# Altium footprint library PCBKU.PcbLib: 197 footprints (part 10 of 13)
Each footprint in its own frame and in the unit in brackets; x right, y up, seen from the top. Pads: shape width x height; smd on the part's side, far side on the other; paste and mask are expansions set on the pad; w line width, h text height; cw(c..) or ccw(c..) is an arc to the next point about the centre after c.
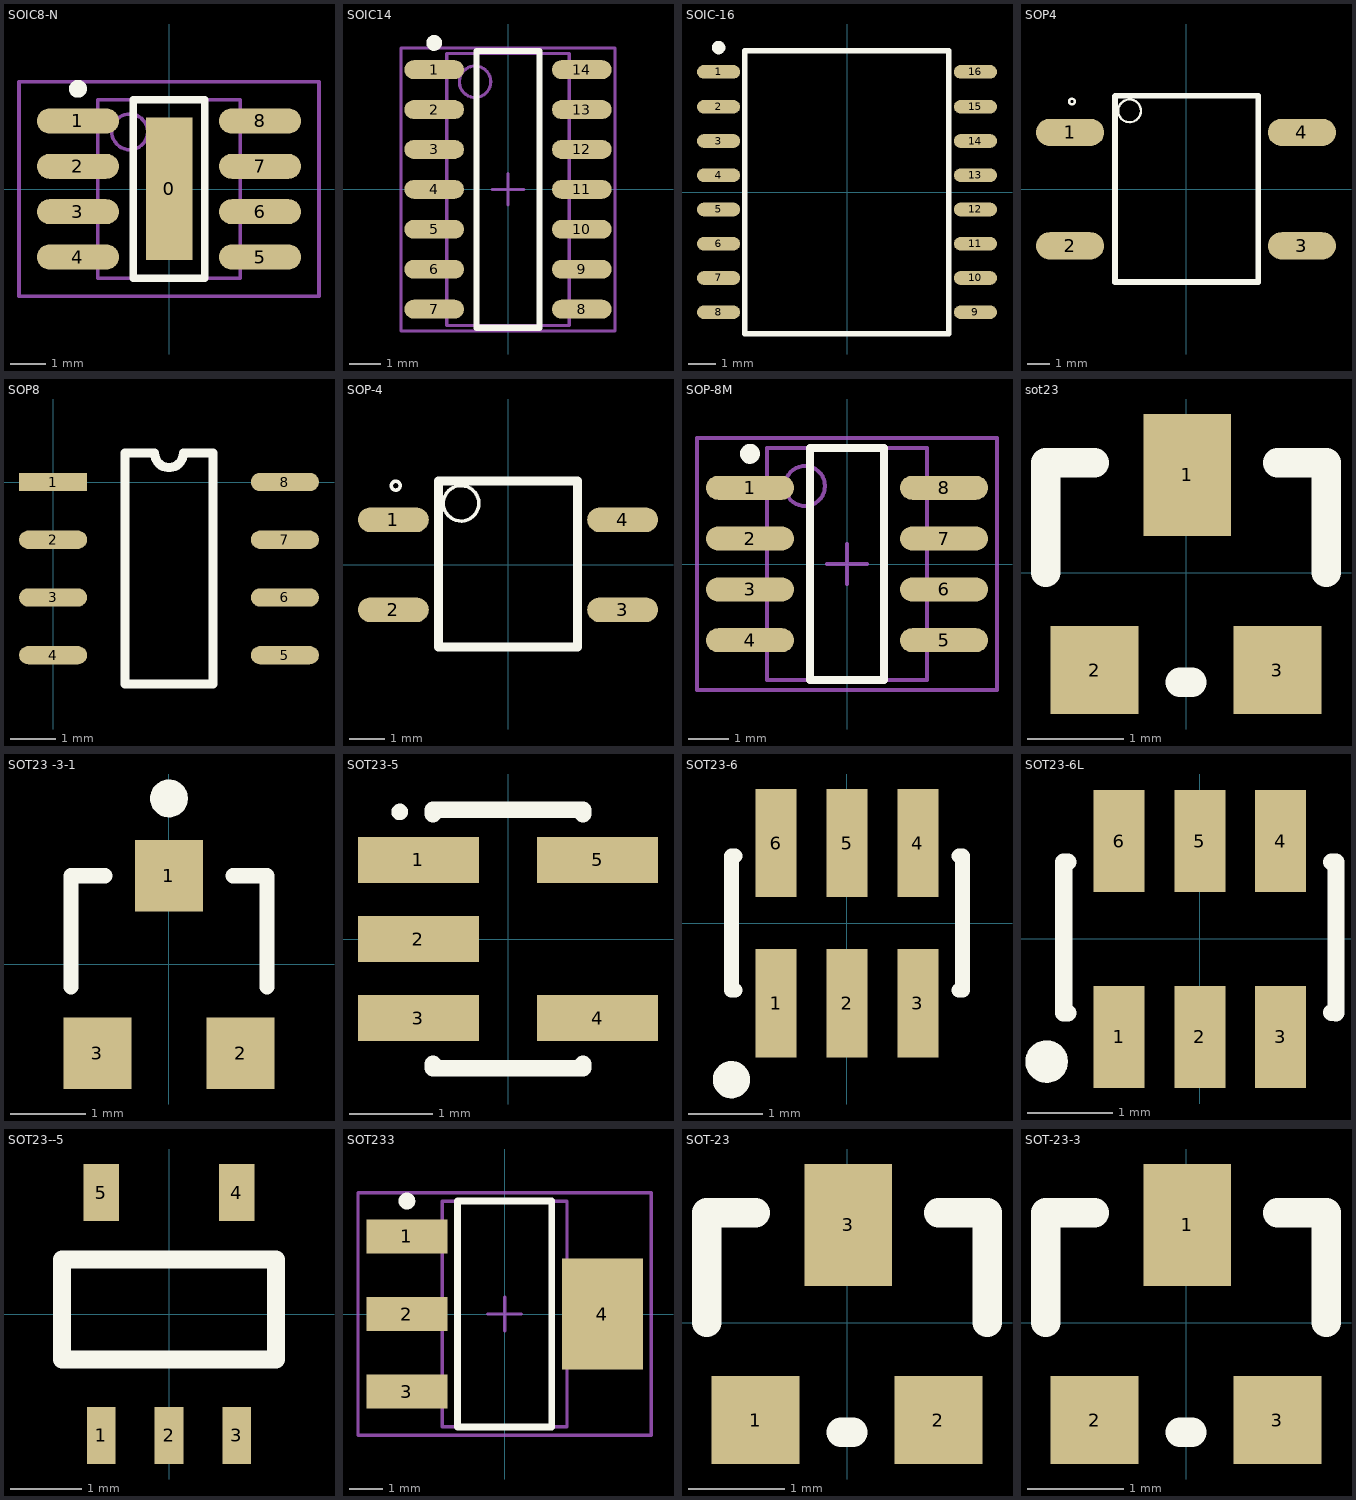
[diagram p9: the footprints below, top view; thin cyan lines are the x and y axes]

## SOIC8-N [mm]
pads (9):
  rect 1.3x4 smd: 0(0.011,0.007)
  oval 2.3x0.7 smd: 1(-2.55,1.905) 2(-2.55,0.635) 3(-2.55,-0.635) 4(-2.55,-1.905) 5(2.55,-1.905) 6(2.55,-0.635) 7(2.55,0.635) 8(2.55,1.905)
Top Overlay:
  circle w0.25: c-2.55,2.805 r0.125
  lines w0.2: -1,-2.5 -1,2.5 1,2.5 1,-2.5 -1,-2.5
Mechanical 13:
  circle w0.1: c-1.1,1.6 r0.5
  lines w0.1: -2,-2.5 -2,2.5 2,2.5 2,-2.5 -2,-2.5
Mechanical 15:
  lines w0.1: -0.5,0 0.5,0 ; 0,-0.5 0,0.5 ; -4.2,-3 -4.2,3 4.2,3 4.2,-3 -4.2,-3
3D body: height 1.55, standoff 0, extent -2,-2.5 2,2.5

## SOIC14 [mm] "14-Pin Small Outline Integrated Circuit 1.27 mm Pitch, IPC High Density"
height 1.91
pads (14):
  oval 1.9x0.6 smd: 1(-2.35,3.81) 2(-2.35,2.54) 3(-2.35,1.27) 4(-2.35,0) 5(-2.35,-1.27) 6(-2.35,-2.54) 7(-2.35,-3.81) 8(2.35,-3.81) 9(2.35,-2.54) 10(2.35,-1.27) 11(2.35,0) 12(2.35,1.27) 13(2.35,2.54) 14(2.35,3.81)
Top Overlay:
  circle w0.25: c-2.35,4.66 r0.125
  lines w0.2: -1,-4.4 -1,4.4 1,4.4 1,-4.4 -1,-4.4
Mechanical 13:
  circle w0.1: c-1.05,3.425 r0.5
  lines w0.1: -1.95,-4.325 -1.95,4.325 1.95,4.325 1.95,-4.325 -1.95,-4.325
Mechanical 15:
  lines w0.1: -0.5,0 0.5,0 ; 0,-0.5 0,0.5 ; -3.4,-4.5 -3.4,4.5 3.4,4.5 3.4,-4.5 -3.4,-4.5
3D body: height 1.91, standoff 0, extent -1.95,-4.325 1.95,4.325

## SOIC-16 [mm]
pads (16):
  oval 1.6x0.51 smd: 1(-4.763,4.458) 2(-4.763,3.162) 3(-4.763,1.892) 4(-4.763,0.622) 5(-4.763,-0.648) 6(-4.763,-1.918) 7(-4.763,-3.188) 8(-4.763,-4.458) 9(4.763,-4.458) 10(4.763,-3.188) 11(4.763,-1.918) 12(4.763,-0.648) 13(4.763,0.622) 14(4.763,1.892) 15(4.763,3.162) 16(4.763,4.458)
Top Overlay:
  circle w0.25: c-4.763,5.358 r0.125
  lines w0.203: -3.797,-5.256 3.772,-5.256 3.772,5.234 -3.797,5.234 -3.797,-5.256

## SOP4 [mm]
height 1.1
pads (4):
  oval 3x1.2 smd: 1(-5.112,2.5) 2(-5.112,-2.5) 3(5.112,-2.5) 4(5.112,2.5)
Top Overlay:
  circle w0.1: c-2.488,3.449 r0.5
  circle w0.1: c-5.027,3.861 r0.125
  lines w0.25: -3.131,-4.1 -3.131,4.1 ; -3.118,-4.095 3.182,-4.095 ; -3.118,4.109 3.182,4.109 ; 3.181,-4.1 3.181,4.1

## SOP8 [mm]
pads (8):
  rect 1.5x0.4 smd: 1(0,0)
  oval 1.5x0.4 smd: 2(0,-1.27) 3(0,-2.54) 4(0,-3.81) 5(5.1,-3.81) 6(5.1,-2.54) 7(5.1,-1.27) 8(5.1,0)
Top Overlay:
  lines w0.2: 1.585,-4.445 1.585,0.635 2.232,0.635 ccw(c2.55,0.635) 2.867,0.635 3.515,0.635 3.515,-4.445 1.585,-4.445

## SOP-4 [mm]
height 1.1
pads (4):
  oval 2x0.7 smd: 1(-3.238,1.272) 2(-3.238,-1.271) 3(3.238,-1.271) 4(3.238,1.272)
Top Overlay:
  circle w0.1: c-3.173,2.235 r0.125
  circle w0.1: c-1.325,1.737 r0.5
  lines w0.25: -1.968,-2.327 -1.968,2.373 ; -1.968,2.372 1.931,2.372 ; -1.931,-2.327 1.968,-2.327 1.968,2.373

## SOP-8M [mm] "SOP, 8-Leads, Body 5.8x4.0mm (max), Pitch 1.27mm, IPC Medium Density"
height 1.75
pads (8):
  oval 2.2x0.6 smd: 1(-2.425,1.905) 2(-2.425,0.635) 3(-2.425,-0.635) 4(-2.425,-1.905) 5(2.425,-1.905) 6(2.425,-0.635) 7(2.425,0.635) 8(2.425,1.905)
Top Overlay:
  circle w0.25: c-2.425,2.755 r0.125
  lines w0.2: -0.925,-2.9 0.925,-2.9 0.925,2.9 -0.925,2.9 -0.925,-2.9
Mechanical 13:
  circle w0.1: c-1.05,1.95 r0.5
  lines w0.1: -2,-2.9 2,-2.9 2,2.9 -2,2.9 -2,-2.9
Mechanical 15:
  lines w0.1: -0.5,0 0.5,0 ; 0,-0.5 0,0.5 ; -3.75,-3.15 3.75,-3.15 3.75,3.15 -3.75,3.15 -3.75,-3.15
3D body: height 1.75, standoff 0.25, extent -2,-2.9 2,2.9

## sot23 [mil]
pads (3):
  rect 36x50 smd: 1(0.5,40)
  rect 36x36 smd: 2(-37.5,-40) 3(37.5,-40)
Top Overlay:
  lines w12: -57.5,0 -57.5,45 -37.5,45 ; -2.5,-45 2.5,-45 ; 37.5,45 57.5,45 57.5,0

## SOT23 -3-1 [mm] "SOT-23; 3 Leads; Body 3.1 x 2.5 mm, inc. leads (LxW max), Alternate Lead Configuration"
height 1.1
pads (3):
  rect 0.9x0.95 smd: 1(0,1.175) 2(0.95,-1.175) 3(-0.95,-1.175)
Top Overlay:
  circle w0.25: c0,2.2 r0.125
  lines w0.2: -1.3,-0.3 -1.3,1.175 -0.85,1.175 ; 0.85,1.175 1.3,1.175 1.3,-0.3
3D body: height 1.05, standoff -0.05, extent -1.473,-1.301 1.527,1.199

## SOT23-5 [mm]
pads (5):
  rect 1.45x0.55 smd: 1(-1.075,0.95) 2(-1.075,0) 3(-1.075,-0.95) 4(1.075,-0.95) 5(1.075,0.95)
Top Overlay:
  circle w0.1: c-1.3,1.525 r0.05
  lines w0.2: -0.9,-1.5 -0.9,-1.55 0.9,-1.55 0.9,-1.5 ; -0.9,1.5 -0.9,1.55 0.9,1.55 0.9,1.5
3D body: height 1.45, standoff 0.01, extent -1.549,-1.549 1.651,1.551

## SOT23-6 [mm]
pads (6):
  rect 0.55x1.45 smd: 1(-0.95,-1.075) 2(0,-1.075) 3(0.95,-1.075) 4(0.95,1.075) 5(0,1.075) 6(-0.95,1.075)
Top Overlay:
  circle w0.25: c-1.55,-2.1 r0.125
  lines w0.2: -1.5,-0.9 -1.55,-0.9 -1.55,0.9 -1.5,0.9 ; 1.5,-0.9 1.55,-0.9 1.55,0.9 1.5,0.9

## SOT23-6L [mm]
pads (6):
  rect 0.6x1.2 smd: 1(-0.95,-1.15) 2(0,-1.15) 3(0.95,-1.15) 4(0.95,1.15) 5(0.001,1.15) 6(-0.95,1.15)
Top Overlay:
  circle w0.25: c-1.801,-1.441 r0.125
  lines w0.2: -1.601,-0.871 -1.551,-0.871 ; -1.601,0.907 -1.551,0.907 ; 1.549,0.907 1.599,0.907 ; 1.55,-0.865 1.6,-0.865
  lines w0.203: -1.6,-0.865 -1.6,0.885 ; 1.6,-0.865 1.6,0.885
3D body: height 1.3, standoff -0.1, extent -1.549,-1.525 1.499,1.475

## SOT23--5 [mm]
pads (5):
  rect 0.4x0.8 smd: 1(-0.95,-1.7) 2(0,-1.7) 3(0.95,-1.7)
  rect 0.5x0.8 smd: 4(0.95,1.7) 5(-0.95,1.7)
Top Overlay:
  lines w0.254: -1.5,-0.635 1.5,-0.635 1.5,0.762 -1.5,0.762 -1.5,-0.635

## SOT233 [mm]
pads (4):
  rect 2.4x1 smd: 1(-2.9,2.3) 2(-2.9,0) 3(-2.9,-2.3)
  rect 2.4x3.3 smd: 4(2.9,0)
Top Overlay:
  circle w0.25: c-2.9,3.35 r0.125
  lines w0.2: -1.4,-3.35 -1.4,3.35 1.4,3.35 1.4,-3.35 -1.4,-3.35
Mechanical 13:
  lines w0.1: -1.85,-3.35 -1.85,3.35 1.85,3.35 1.85,-3.35 -1.85,-3.35
Mechanical 15:
  lines w0.1: -0.5,0 0.5,0 ; 0,-0.5 0,0.5 ; -4.35,-3.6 -4.35,3.6 4.35,3.6 4.35,-3.6 -4.35,-3.6
3D body: height 1.8, standoff 0, extent -1.85,-3.35 1.85,3.35

## SOT-23 [mil]
pads (3):
  rect 36x36 smd: 1(-37.5,-40) 2(37.5,-40)
  rect 36x50 smd: 3(0.5,40)
Top Overlay:
  lines w12: -57.5,0 -57.5,45 -37.5,45 ; -2.5,-45 2.5,-45 ; 37.5,45 57.5,45 57.5,0
3D body: height 41.34, standoff -1.97, extent -59.11,-49.21 59,49.21

## SOT-23-3 [mil]
pads (3):
  rect 36x50 smd: 1(0.5,40)
  rect 36x36 smd: 2(-37.5,-40) 3(37.5,-40)
Top Overlay:
  lines w12: -57.5,0 -57.5,45 -37.5,45 ; -2.5,-45 2.5,-45 ; 37.5,45 57.5,45 57.5,0
3D body: height 41.34, standoff -1.97, extent -60.06,-50.43 58.06,48